# Altium footprint library SoM_Artix.PcbLib: 239 footprints (part 11 of 15)
Each footprint in its own frame and in the unit in brackets; x right, y up, seen from the top. Pads: shape width x height; smd on the part's side, far side on the other; paste and mask are expansions set on the pad; w line width, h text height; cw(c..) or ccw(c..) is an arc to the next point about the centre after c.
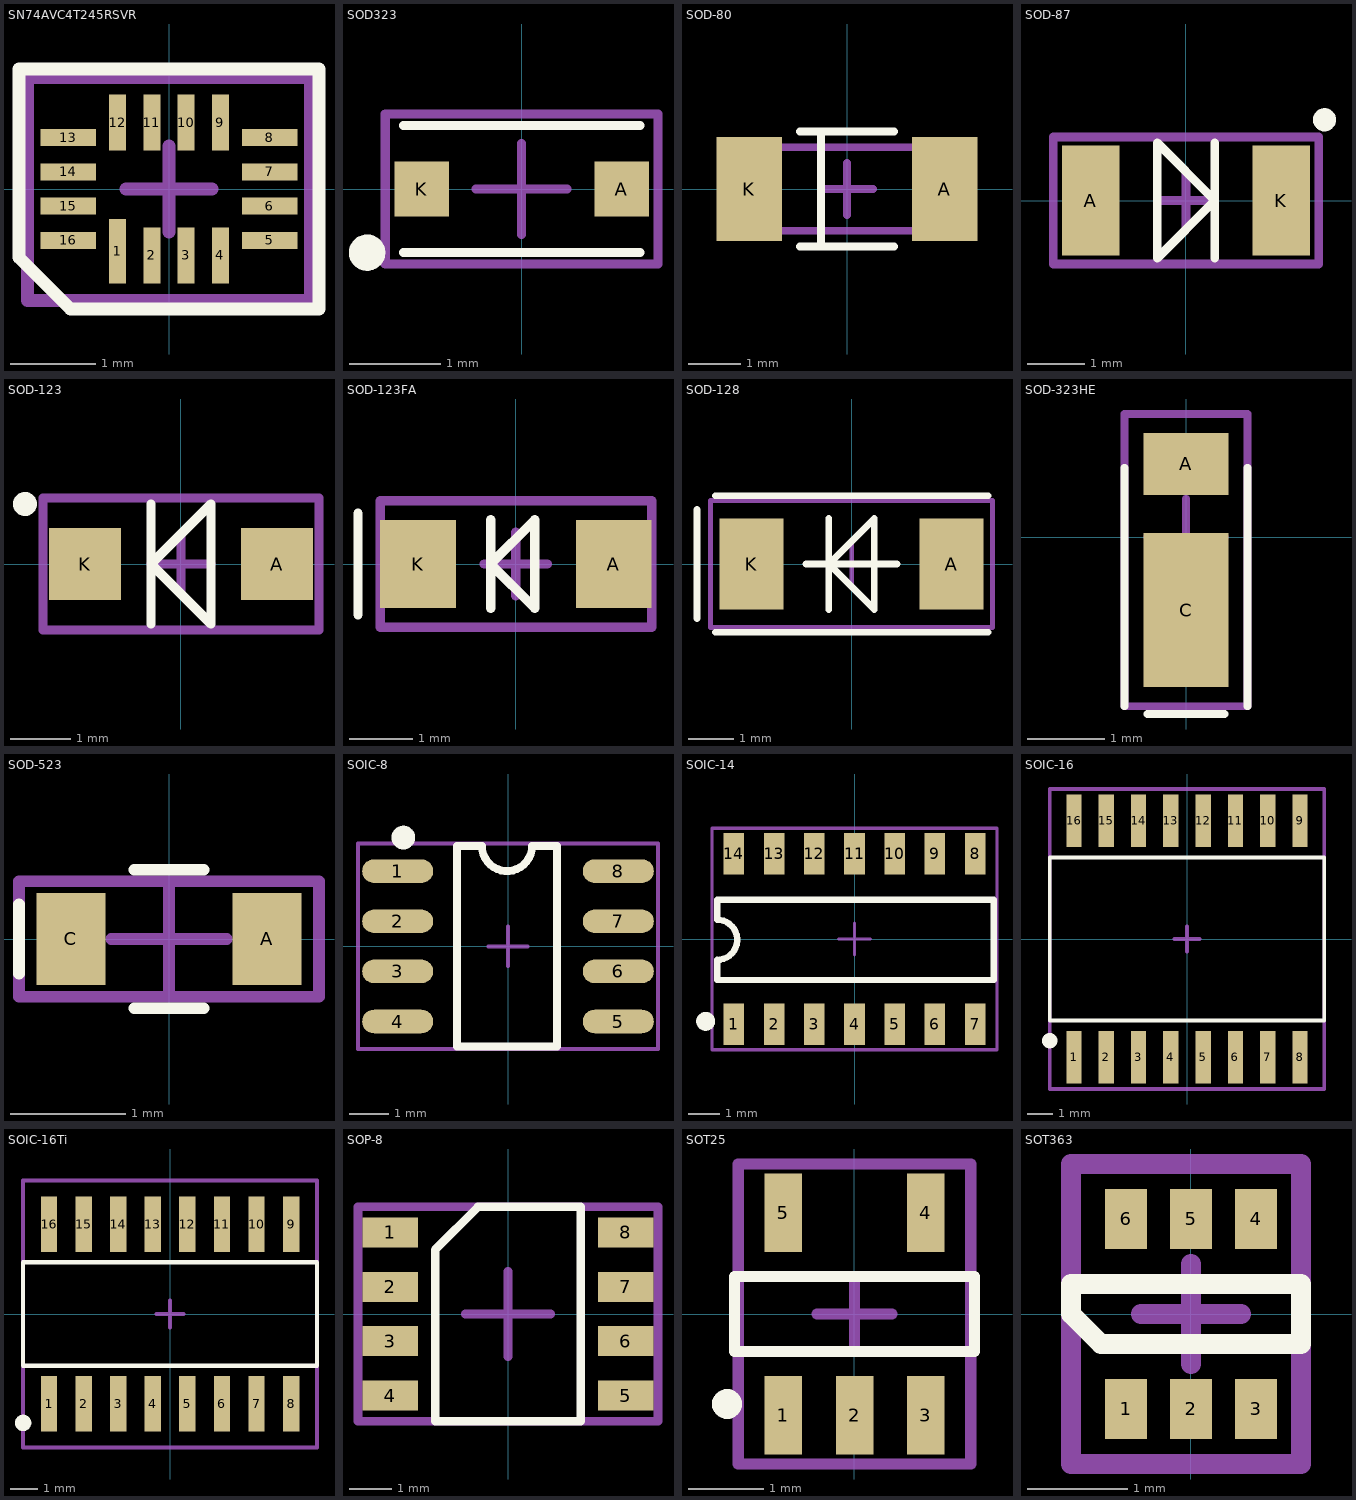
[diagram p10: the footprints below, top view; thin cyan lines are the x and y axes]

## SN74AVC4T245RSVR [mm]
pads (16):
  rect 0.2x0.75 smd mask+0.05: 1(-0.6,-0.725)
  rect 0.2x0.65 smd mask+0.05: 2(-0.2,-0.775) 3(0.2,-0.775) 4(0.6,-0.775) 9(0.6,0.775) 10(0.2,0.775) 11(-0.2,0.775) 12(-0.6,0.775)
  rect 0.65x0.2 smd mask+0.05: 5(1.175,-0.6) 6(1.175,-0.2) 7(1.175,0.2) 8(1.175,0.6) 13(-1.175,0.6) 14(-1.175,0.2) 15(-1.175,-0.2) 16(-1.175,-0.6)
Top Overlay:
  lines w0.15: -1.75,-0.8 -1.15,-1.4 1.75,-1.4 1.75,1.4 -1.75,1.4 -1.75,-0.8
Mechanical 15:
  lines w0.15: -0.5,0 0.5,0 ; 0,-0.5 0,0.5 ; -1.65,-1.3 -1.65,1.3 1.65,1.3 1.65,-1.3 -1.65,-1.3
3D body "User Library-UQFN-16-0_4(Case 2_6mmx1_8mm Height 0_55mm).STEP": height 0.56, standoff 0, extent -1.31,-0.91 1.31,0.91

## SOD323 [mm]
height 1.1
pads (2):
  rect 0.6x0.6 smd: A(1.1,0) K(-1.1,0)
Top Overlay:
  circle w0.2: c-1.7,-0.7 r0.1
  lines w0.1: -1.3,-0.7 1.3,-0.7 ; -1.3,0.7 1.3,0.7
Mechanical 13:
  lines w0.1: -0.5,0 0.5,0 ; 0,-0.5 0,0.5 ; -1.5,-0.825 1.5,-0.825 1.5,0.825 -1.5,0.825 -1.5,-0.825
3D body "User Library-SOD2513X11.step": height 1.1, standoff 0, extent -1.35,-0.625 1.35,0.625

## SOD-80 [mm]
height 1.4
pads (2):
  rect 1.25x2 smd: A(1.875,0) K(-1.875,0)
Top Overlay:
  lines w0.15: -0.9,-1.1 0.9,-1.1 ; -0.9,1.1 0.9,1.1 ; -0.5,-1.1 -0.5,1.1
Mechanical 13:
  lines w0.15: -0.5,0 0.5,0 ; 0,-0.5 0,0.5 ; -1.8,-0.8 1.8,-0.8 1.8,0.8 -1.8,0.8 -1.8,-0.8
3D body "User Library-SOD80-3.STEP": height 1.5, standoff 0, extent -1.8,-0.7 1.8,0.8

## SOD-87 [mm]
pads (2):
  rect 1x1.9 smd: A(-1.65,0) K(1.65,0)
Top Overlay:
  circle w0.2: c2.4,1.4 r0.1
  lines w0.15: 0.5,-1 0.5,1 ; -0.5,-1 -0.5,1 0.5,0 -0.5,-1
Mechanical 13:
  lines w0.15: -0.5,0 0.5,0 ; 0,-0.5 0,0.5 ; -2.3,-1.1 2.3,-1.1 2.3,1.1 -2.3,1.1 -2.3,-1.1
3D body "User Library-SOD87.step": height 1.16, standoff 0, extent -1.75,-1 1.75,1

## SOD-123 [mm]
pads (2):
  rect 1.2x1.2 smd: A(1.6,0) K(-1.6,0)
Top Overlay:
  circle w0.2: c-2.6,1 r0.1
  lines w0.15: -0.5,-1 -0.5,1 ; -0.5,0 0.5,-1 0.5,1 -0.5,0
Mechanical 13:
  lines w0.15: -0.5,0 0.5,0 ; 0,-0.5 0,0.5 ; -2.3,-1.1 2.3,-1.1 2.3,1.1 -2.3,1.1 -2.3,-1.1
3D body "User Library-SOD123-1.step": height 1.18, standoff 0, extent -1.95,-0.9 1.95,0.9

## SOD-123FA [mm]
pads (2):
  rect 1.2x1.4 smd: A(1.55,0) K(-1.55,0)
Top Overlay:
  lines w0.15: -2.5,-0.8 -2.5,0.8 ; -0.4,-0.7 -0.4,0.7 ; -0.4,0 0.3,-0.7 0.3,0.7 -0.4,0
Mechanical 13:
  lines w0.15: -0.5,0 0.5,0 ; 0,-0.5 0,0.5 ; -2.15,-1 2.15,-1 2.15,1 -2.15,1 -2.15,-1
3D body "User Library-SOD-123F.step": height 1.02, standoff 0, extent -1.9,-0.9 1.9,0.9

## SOD-128 [mm]
pads (2):
  rect 1.4x2 smd: A(2.2,0) K(-2.2,0)
Top Overlay:
  lines w0.15: -3.4,-1.2 -3.4,1.2 ; -3,-1.5 3,-1.5 ; -3,1.5 3,1.5 ; -1,0 1,0 ; -0.5,-1 -0.5,1 ; -0.5,0 0.5,-1 0.5,1 -0.5,0
Mechanical 13:
  lines w0.1: -0.5,0 0.5,0 ; 0,-0.5 0,0.5
  lines w0.11: -3.1,-1.4 3.1,-1.4 3.1,1.4 -3.1,1.4 -3.1,-1.4
3D body "User Library-SOD-128Flat.step": height 1.02, standoff 0, extent -2.4,-1.25 2.4,1.25

## SOD-323HE [mm]
pads (2):
  rect 1.1x0.8 smd: A(0,0.95)
  rect 1.1x2 smd: C(0,-0.95)
Top Overlay:
  lines w0.1: -0.8,-2.2 -0.8,0.9 ; -0.5,-2.3 0.5,-2.3 ; 0.8,-2.2 0.8,0.9
Mechanical 15:
  lines w0.1: -0.5,0 0.5,0 ; 0,-0.5 0,0.5 ; -0.8,-2.2 0.8,-2.2 0.8,1.6 -0.8,1.6 -0.8,-2.2
3D body "TUMD2M.step": height 0.6, standoff 0, extent -0.7,-1.55 0.7,0.95

## SOD-523 [mm]
pads (2):
  rect 0.6x0.8 smd mask+0.05: A(0.85,0) C(-0.85,0)
Top Overlay:
  lines w0.1: -1.3,-0.3 -1.3,0.3 ; -0.3,-0.6 0.3,-0.6 ; -0.3,0.6 0.3,0.6
Mechanical 15:
  lines w0.1: -0.5,0 0.5,0 ; 0,-0.5 0,0.5 ; -1.3,-0.5 -1.3,0.5 1.3,0.5 1.3,-0.5 -1.3,-0.5
3D body "User Library-SOD-523F.step": height 0.7, standoff 0, extent -0.8,-0.399 0.8,0.399

## SOIC-8 [mm] "6x5x1.75 mm"
height 1.75
pads (8):
  oval 1.8x0.6 smd: 1(-2.794,1.905) 2(-2.794,0.635) 3(-2.794,-0.635) 4(-2.794,-1.905) 5(2.794,-1.905) 6(2.794,-0.635) 7(2.794,0.635) 8(2.794,1.905)
Top Overlay:
  circle w0.3: c-2.65,2.755 r0.15
  lines w0.2: -1.295,-2.54 1.245,-2.54 1.245,2.54 0.61,2.54 cw(c-0.025,2.54) -0.66,2.54 -1.295,2.54 -1.295,-2.54
Mechanical 15:
  lines w0.1: -0.5,0 0.5,0 ; 0,-0.5 0,0.5 ; -3.8,-2.6 -3.8,2.6 3.8,2.6 3.8,-2.6 -3.8,-2.6
3D body "User Library-so-8.step": height 1.88, standoff -0.03, extent -3.169,-2.5 3.169,2.504

## SOIC-14 [mm]
pads (14):
  rect 0.65x1.31 smd mask+0.05: 1(-3.81,-2.7) 2(-2.54,-2.7) 3(-1.27,-2.7) 4(0,-2.7) 5(1.27,-2.7) 6(2.54,-2.7) 7(3.81,-2.7) 8(3.81,2.7) 9(2.54,2.7) 10(1.27,2.7) 11(0,2.7) 12(-1.27,2.7) 13(-2.54,2.7) 14(-3.81,2.7)
Top Overlay:
  circle w0.3: c-4.7,-2.6 r0.15
  lines w0.2: -4.34,-1.295 -4.34,-0.66 ccw(c-4.34,-0.025) -4.34,0.61 -4.34,1.245 4.4,1.245 4.4,-1.295 -4.34,-1.295
Mechanical 15:
  lines w0.1: -0.5,0 0.5,0 ; 0,-0.5 0,0.5 ; -4.5,-3.5 4.5,-3.5 4.5,3.5 -4.5,3.5 -4.5,-3.5
3D body "User Library-SOIC14-150.step": height 1.75, standoff 0, extent -4.275,-2.9 4.275,2.9

## SOIC-16 [mm]
pads (16):
  rect 0.6x2.05 smd: 1(-4.445,-4.65) 2(-3.175,-4.65) 3(-1.905,-4.65) 4(-0.635,-4.65) 5(0.635,-4.65) 6(1.905,-4.65) 7(3.175,-4.65) 8(4.445,-4.65) 9(4.445,4.65) 10(3.175,4.65) 11(1.905,4.65) 12(0.635,4.65) 13(-0.635,4.65) 14(-1.905,4.65) 15(-3.175,4.65) 16(-4.445,4.65)
Top Overlay:
  circle w0.3: c-5.4,-4 r0.15
  lines w0.15: -5.4,-3.2 5.4,-3.2 5.4,3.2 -5.4,3.2 -5.4,-3.2
Mechanical 15:
  lines w0.15: -0.5,0 0.5,0 ; 0,-0.5 0,0.5 ; -5.4,-5.9 5.4,-5.9 5.4,5.9 -5.4,5.9 -5.4,-5.9
3D body "User Library-so16w.step": height 3.5, standoff 0, extent -5.1,-5.15 5.1,5.15

## SOIC-16Ti [mm]
pads (16):
  rect 0.6x2.05 smd: 1(-4.445,-3.3) 2(-3.175,-3.3) 3(-1.905,-3.3) 4(-0.635,-3.3) 5(0.635,-3.3) 6(1.905,-3.3) 7(3.175,-3.3) 8(4.445,-3.3) 9(4.445,3.3) 10(3.175,3.3) 11(1.905,3.3) 12(0.635,3.3) 13(-0.635,3.3) 14(-1.905,3.3) 15(-3.175,3.3) 16(-4.445,3.3)
Top Overlay:
  circle w0.3: c-5.4,-4 r0.15
  lines w0.15: -5.4,-1.9 5.4,-1.9 5.4,1.9 -5.4,1.9 -5.4,-1.9
Mechanical 15:
  lines w0.15: -0.5,0 0.5,0 ; 0,-0.5 0,0.5 ; -5.4,-4.9 5.4,-4.9 5.4,4.9 -5.4,4.9 -5.4,-4.9
3D body "User Library-so16.step": height 1.7, standoff 0, extent -5.1,-3 5.1,3

## SOP-8 [mm]
pads (8):
  rect 1.3x0.7 smd: 1(-2.75,1.905) 2(-2.75,0.635) 3(-2.75,-0.635) 4(-2.75,-1.905) 5(2.75,-1.905) 6(2.75,-0.635) 7(2.75,0.635) 8(2.75,1.905)
Top Overlay:
  lines w0.2: -1.7,-2.5 -1.7,1.5 -0.7,2.5 1.7,2.5 1.7,-2.5 -1.7,-2.5
Mechanical 15:
  lines w0.2: -1,0 1,0 ; 0,-1 0,1 ; -3.5,-2.5 -3.5,2.5 3.5,2.5 3.5,-2.5 -3.5,-2.5
3D body "User Library-so-8.step": height 1.88, standoff -0.03, extent -3.169,-2.5 3.169,2.504

## SOT25 [mm]
pads (5):
  rect 0.5x1.05 smd: 1(-0.95,-1.35) 2(0,-1.35) 3(0.95,-1.35) 4(0.95,1.35) 5(-0.95,1.35)
Top Overlay:
  circle w0.2: c-1.7,-1.2 r0.1
  lines w0.15: -1.6,-0.5 1.6,-0.5 1.6,0.5 -1.6,0.5 -1.6,-0.5
Mechanical 13:
  lines w0.15: -0.5,0 0.5,0 ; 0,-0.5 0,0.5 ; -1.55,-2 1.55,-2 1.55,2 -1.55,2 -1.55,-2
3D body "User Library-SOT-25.step": height 1.2, standoff 0, extent -1.45,-1.4 1.45,1.4

## SOT363 [mm]
pads (6):
  rect 0.42x0.6 smd mask+0.05: 1(-0.65,-0.95) 2(0,-0.95) 3(0.65,-0.95) 4(0.65,0.95) 5(0,0.95) 6(-0.65,0.95)
Top Overlay:
  lines w0.2: -1.2,0 -1.2,0.3 1.1,0.3 1.1,-0.3 -0.9,-0.3 -1.2,0
Mechanical 15:
  lines w0.2: -0.5,0 0.5,0 ; 0,-0.5 0,0.5 ; -1.2,-1.5 1.1,-1.5 1.1,1.5 -1.2,1.5 -1.2,-1.5
3D body "User Library-sot363.step": height 1, standoff 0, extent -1.05,-1.15 1.05,1.15